# Altium footprint library tsl_Pcblib.PcbLib: 219 footprints (part 3 of 14)
Each footprint in its own frame and in the unit in brackets; x right, y up, seen from the top. Pads: shape width x height; smd on the part's side, far side on the other; paste and mask are expansions set on the pad; w line width, h text height; cw(c..) or ccw(c..) is an arc to the next point about the centre after c.
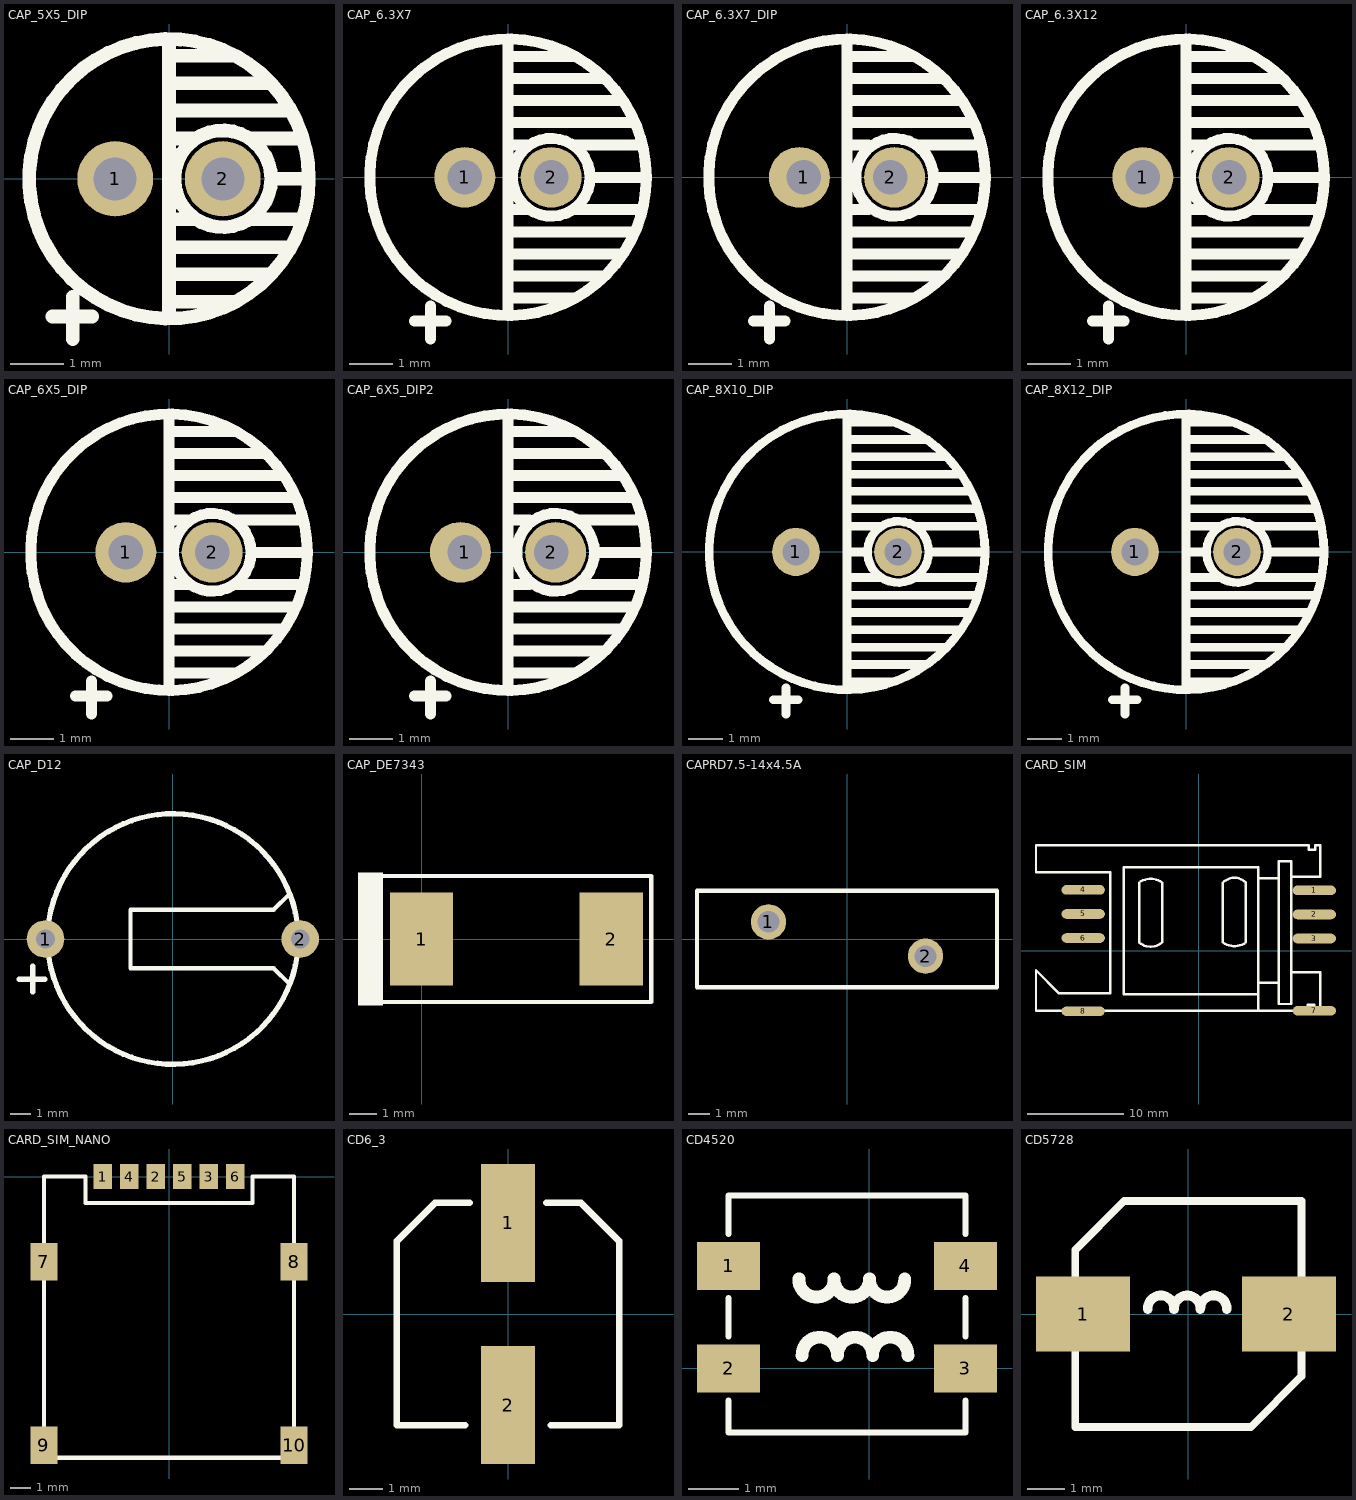
[diagram p2: the footprints below, top view; thin cyan lines are the x and y axes]

## CAP_5X5_DIP [mm]
pads (2):
  oval 1.41x1.4 / inner oval 1.41x1.4 / far side oval 1.51x1.5 hole 0.8: 1(-1,0) 2(1,0)
Top Overlay:
  circle w0.254: c1,0 r0.9
  circle w0.254: c0,0 r2.6
  lines w0.254: -2.167,-2.562 -1.43,-2.562 ; -1.792,-2.979 -1.792,-2.192 ; 0,-2.55 0,2.55 ; 0,-2.286 1.2,-2.286 ; 0,-1.778 1.85,-1.778 ; 0,-1.27 2.2,-1.27 ; 0,-0.75 0.5,-0.75 ; 0,0.75 0.5,0.75 ; 0,1.27 2.2,1.27 ; 0,1.778 1.85,1.778 ; 0,2.286 1.2,2.286 ; 1.5,-0.75 2.45,-0.75 ; 1.5,0.75 2.45,0.75 ; 1.9,0 2.55,0

## CAP_6.3X7 [mm]
pads (2):
  oval 1.41x1.4 / inner oval 1.41x1.4 / far side oval 1.51x1.5 hole 0.8: 1(-1,0) 2(1,0)
Top Overlay:
  circle w0.254: c0,0 r3.2
  circle w0.254: c1,0 r0.9
  lines w0.254: -2.167,-3.324 -1.43,-3.324 ; -1.792,-3.741 -1.792,-2.979 ; 0,-3.2 0,3.2 ; 0,-2.794 1.524,-2.794 ; 0,-2.286 2.2,-2.286 ; 0,-1.778 2.65,-1.778 ; 0,-1.27 2.9,-1.27 ; 0,-0.75 0.5,-0.75 ; 0,0.75 0.5,0.75 ; 0,1.27 2.9,1.27 ; 0,1.778 2.6,1.778 ; 0,2.286 2.2,2.286 ; 0,2.794 1.55,2.794 ; 1.55,-0.75 3.1,-0.75 ; 1.55,0.75 3.05,0.75 ; 2,0 3.15,0

## CAP_6.3X7_DIP [mm]
pads (2):
  oval 1.41x1.4 / inner oval 1.41x1.4 / far side oval 1.51x1.5 hole 0.8 copper offset -0.1,0: 1(-1,0)
  oval 1.41x1.4 / inner oval 1.41x1.4 / far side oval 1.51x1.5 hole 0.8 copper offset 0.1,0: 2(1,0)
Top Overlay:
  circle w0.254: c1.1,0 r0.9
  circle w0.254: c0,0 r3.2
  lines w0.254: -2.167,-3.324 -1.43,-3.324 ; -1.792,-3.741 -1.792,-2.979 ; 0,-3.2 0,3.2 ; 0,-2.794 1.524,-2.794 ; 0,-2.286 2.2,-2.286 ; 0,-1.778 2.65,-1.778 ; 0,-1.27 2.9,-1.27 ; 0,-0.75 0.5,-0.75 ; 0,0.75 0.5,0.75 ; 0,1.27 2.9,1.27 ; 0,1.778 2.6,1.778 ; 0,2.286 2.2,2.286 ; 0,2.794 1.55,2.794 ; 1.65,-0.75 3.1,-0.75 ; 1.65,0.75 3.05,0.75 ; 2,0 3.15,0
Bottom Overlay:
  rectangle: -0.3,-1.016 0.3,1.016
3D body "User Library-Cap electro 6_3x7x2_5mm.step": height 7.33, standoff -3.21, extent -3.175,-3.175 3.176,3.176

## CAP_6.3X12 [mm]
pads (2):
  oval 1.41x1.4 / inner oval 1.41x1.4 / far side oval 1.51x1.5 hole 0.8: 1(-1,0) 2(1,0)
Top Overlay:
  circle w0.254: c0,0 r3.2
  circle w0.254: c1,0 r0.9
  lines w0.254: -2.167,-3.324 -1.43,-3.324 ; -1.792,-3.741 -1.792,-2.979 ; 0,-3.2 0,3.2 ; 0,-2.794 1.524,-2.794 ; 0,-2.286 2.2,-2.286 ; 0,-1.778 2.65,-1.778 ; 0,-1.27 2.9,-1.27 ; 0,-0.75 0.5,-0.75 ; 0,0.75 0.5,0.75 ; 0,1.27 2.9,1.27 ; 0,1.778 2.6,1.778 ; 0,2.286 2.2,2.286 ; 0,2.794 1.55,2.794 ; 1.55,-0.75 3.1,-0.75 ; 1.55,0.75 3.05,0.75 ; 2,0 3.15,0

## CAP_6X5_DIP [mm]
pads (2):
  oval 1.41x1.4 / inner oval 1.41x1.4 / far side oval 1.51x1.5 hole 0.8: 1(-1,0) 2(1,0)
Top Overlay:
  circle w0.254: c1,0 r0.9
  circle w0.254: c0,0 r3.2
  lines w0.254: -2.167,-3.324 -1.43,-3.324 ; -1.792,-3.741 -1.792,-2.979 ; 0,-3.2 0,3.2 ; 0,-2.794 1.524,-2.794 ; 0,-2.286 2.2,-2.286 ; 0,-1.778 2.65,-1.778 ; 0,-1.27 2.9,-1.27 ; 0,-0.75 0.5,-0.75 ; 0,0.75 0.5,0.75 ; 0,1.27 2.9,1.27 ; 0,1.778 2.6,1.778 ; 0,2.286 2.2,2.286 ; 0,2.794 1.55,2.794 ; 1.55,-0.75 3.1,-0.75 ; 1.55,0.75 3.05,0.75 ; 2,0 3.15,0

## CAP_6X5_DIP2 [mm]
pads (2):
  oval 1.41x1.4 / inner oval 1.41x1.4 / far side oval 1.51x1.5 hole 0.8 copper offset -0.1,0: 1(-1,0)
  oval 1.41x1.4 / inner oval 1.41x1.4 / far side oval 1.51x1.5 hole 0.8 copper offset 0.1,0: 2(1,0)
Top Overlay:
  circle w0.254: c0,0 r3.2
  circle w0.254: c1.1,0 r0.9
  lines w0.254: -2.167,-3.324 -1.43,-3.324 ; -1.792,-3.741 -1.792,-2.979 ; 0,-3.2 0,3.2 ; 0,-2.794 1.524,-2.794 ; 0,-2.286 2.2,-2.286 ; 0,-1.778 2.65,-1.778 ; 0,-1.27 2.9,-1.27 ; 0,-0.75 0.5,-0.75 ; 0,0.75 0.5,0.75 ; 0,1.27 2.9,1.27 ; 0,1.778 2.6,1.778 ; 0,2.286 2.2,2.286 ; 0,2.794 1.55,2.794 ; 1.65,-0.75 3.1,-0.75 ; 1.65,0.75 3.05,0.75 ; 2,0 3.15,0
Bottom Overlay:
  rectangle: -0.3,-1.016 0.3,1.016
3D body "User Library-Cap electrolitic radial 6,3x5.STEP": height 5.2, standoff -1.3, extent -3.149,-3.15 3.15,3.15

## CAP_8X10_DIP [mm]
pads (2):
  oval 1.4x1.41 / inner oval 1.4x1.41 / far side oval 2x2.5 hole 0.8: 1(-1.5,0) 2(1.5,0)
Top Overlay:
  circle w0.254: c1.5,0 r0.9
  circle w0.254: c0,0 r4.05
  lines w0.254: -2.167,-4.34 -1.43,-4.34 ; -1.792,-4.757 -1.792,-3.995 ; 0,-4 0,4 ; 0,-3.81 1.35,-3.81 ; 0,-3.302 2.3,-3.302 ; 0,-2.794 2.9,-2.794 ; 0,-2.286 3.3,-2.286 ; 0,-1.778 3.6,-1.778 ; 0,-1.27 3.8,-1.27 ; 0,-0.75 1,-0.75 ; 0,0 0.6,0 ; 0,0.75 1,0.75 ; 0,1.27 3.8,1.27 ; 0,1.778 3.6,1.778 ; 0,2.286 3.3,2.286 ; 0,2.794 2.9,2.794 ; 0,3.302 2.3,3.302 ; 0,3.81 1.35,3.81 ; 2.05,-0.75 3.95,-0.75 ; 2.05,0.75 3.95,0.75 ; 2.45,0 4,0

## CAP_8X12_DIP [mm]
pads (2):
  oval 1.4x1.41 / inner oval 1.4x1.41 / far side oval 2x2.5 hole 0.8: 1(-1.5,0) 2(1.5,0)
Top Overlay:
  circle w0.254: c0,0 r4.05
  circle w0.254: c1.5,0 r0.9
  lines w0.254: -2.167,-4.34 -1.43,-4.34 ; -1.792,-4.757 -1.792,-3.995 ; 0,-4 0,4 ; 0,-3.81 1.35,-3.81 ; 0,-3.302 2.3,-3.302 ; 0,-2.794 2.9,-2.794 ; 0,-2.286 3.3,-2.286 ; 0,-1.778 3.6,-1.778 ; 0,-1.27 3.8,-1.27 ; 0,-0.75 1,-0.75 ; 0,0 0.6,0 ; 0,0.75 1,0.75 ; 0,1.27 3.8,1.27 ; 0,1.778 3.6,1.778 ; 0,2.286 3.3,2.286 ; 0,2.794 2.9,2.794 ; 0,3.302 2.3,3.302 ; 0,3.81 1.35,3.81 ; 2.05,-0.75 3.95,-0.75 ; 2.05,0.75 3.95,0.75 ; 2.45,0 4,0

## CAP_D12 [mm]
pads (2):
  round 1.8 hole 0.9: 1(-6.096,0) 2(6.096,0)
Top Overlay:
  circle w0.254: c0,0 r6
  lines w0.203: 5.588,-2.159 4.826,-1.397 -2.032,-1.397 -2.032,0 -2.032,1.397 4.826,1.397 5.588,2.159
  lines w0.254: -7.366,-1.927 -6.129,-1.927 ; -6.709,-2.54 -6.709,-1.303

## CAP_DE7343 [mm]
pads (2):
  rect 2.3x3.4 smd: 1(0,0) 2(6.9,0)
Top Overlay:
  rectangle: -2.311,-2.413 -1.397,2.413
  lines w0.152: -1.575,2.286 8.357,2.286 8.357,-2.286 -1.524,-2.286
3D body "User Library-AVX_D_CASE.STEP": height 3.01, standoff 0, extent -0.271,-2.225 7.13,2.225

## CAPRD7.5-14x4.5A [mil] "Capacitor, Ceramic, Thru-Hole, Disc; Body 14 x 4.5 mm (LxW max) Pin Spacing 7.5 mm (typ)"
height 669.29
pads (2):
  round 65 hole 40: 1(-144.24,31.5) 2(144.24,-31.5)
Top Overlay:
  lines w7.87: -275.59,-88.58 275.59,-88.58 275.59,88.58 -275.59,88.58 -275.59,-88.58

## CARD_SIM [mm]
pads (8):
  oval 4.5x1 smd: 1(12,6.25) 2(12,3.75) 3(12,1.25) 4(-12,6.3) 5(-12,3.8) 6(-12,1.3) 7(12,-6.25) 8(-12,-6.3)
Top Overlay:
  lines w0.254: -6.2,7.05 -6.2,0.85 ccw(c-5,2.25) -3.8,0.85 -3.8,7.05 ; -6.199,7.051 cw(c-5,5.5) -3.799,7.049 ; 2.5,0.85 ccw(c3.7,2.438) 4.9,0.85 ; 2.5,7.05 cw(c3.7,5.87) 4.9,7.05 ; 2.5,0.85 2.5,7.05 ; 4.9,0.85 4.9,7.05 ; 6.2,-6.25 6.2,8.65 -7.8,8.65 -7.8,-4.55 6.2,-4.55 ; 6.2,-3.35 8.3,-3.35 ; 6.2,7.52 8.3,7.52 ; -16.9,-6.25 11.3,-6.25 11.3,-5.65 12,-5.65 12,-6.25 12.6,-6.25 12.6,-2.25 9.6,-2.25 9.6,7.65 12.6,7.65 12.6,10.95 12.1,10.95 12.1,10.45 11.4,10.45 11.4,10.95 -16.9,10.95 -16.9,8.15 -9.2,8.15 -9.2,-4.45 -14.5,-4.45 -16.9,-2.05 -16.9,-6.25 ; 8.3,-5.55 8.3,9.25 9.6,9.25 9.6,-5.55 8.3,-5.55
3D body "User Library-SIM5060-6-0-26-01-A.STEP": height 2.4, standoff -0.9, extent -16.383,-6.06 13.257,11.14

## CARD_SIM_NANO [mm]
pads (10):
  rect 0.9x1.2 smd: 1(-3.175,0) 2(-0.635,0) 3(1.905,0) 4(-1.905,0) 5(0.635,0) 6(3.175,0)
  rect 1.3x1.8 smd: 7(-6,-4.1) 8(6,-4.1) 9(-6,-12.9) 10(6,-12.9)
Top Overlay:
  lines w0.2: -6,-13.5 -6,0 -4,0 -4,-1.27 4,-1.27 4,0 6,0 6,-13.5 -6,-13.5

## CD6_3 [mm]
pads (2):
  rect 1.6x3.5 smd paste-0.05 mask+0.05: 1(0,2.7) 2(0,-2.7)
Top Overlay:
  lines w0.203: -1.27,-3.302 -1.27,-3.3 -3.3,-3.3 -3.3,0 -3.3,2.161 -2.161,3.3 -1.143,3.3 ; 1.143,3.3 2.161,3.3 3.3,2.161 3.3,0 3.3,-3.3 1.27,-3.3

## CD4520 [mm]
height 2
pads (4):
  rect 1.25x0.95 smd: 1(-2.794,2.032) 2(-2.794,0) 3(1.905,0) 4(1.905,2.032)
Top Overlay:
  lines w0.127: -2.794,-0.635 -2.794,-1.27 1.905,-1.27 1.905,-0.635 ; -2.794,0.635 -2.794,1.397 ; -2.794,2.667 -2.794,3.429 1.905,3.429 1.905,2.667 ; 1.905,0.635 1.905,1.397
  lines w0.254: -1.399,1.778 ccw(c-1.049,1.763) -0.699,1.778 ccw(c-0.35,1.763) 0,1.778 ccw(c0.35,1.763) 0.699,1.778 ; -1.334,0.254 cw(c-0.985,0.269) -0.635,0.254 cw(c-0.285,0.269) 0.064,0.254 cw(c0.414,0.269) 0.764,0.254

## CD5728 [mm]
pads (2):
  rect 2.5x2 smd: 1(-2.794,0) 2(2.667,0)
Top Overlay:
  lines w0.203: -3,-3 -3,0 -3,1.699 -1.699,3 0,3 3,3 3,0 3,-1.651 1.651,-3 0,-3 -3,-3
  lines w0.254: -1.08,0.127 cw(c-0.731,0.142) -0.381,0.127 cw(c-0.031,0.142) 0.318,0.127 cw(c0.668,0.142) 1.018,0.127